# Altium footprint library THU VIEN PCB.PCBLib: 534 footprints (part 23 of 34)
Each footprint in its own frame and in the unit in brackets; x right, y up, seen from the top. Pads: shape width x height; smd on the part's side, far side on the other; paste and mask are expansions set on the pad; w line width, h text height; cw(c..) or ccw(c..) is an arc to the next point about the centre after c.
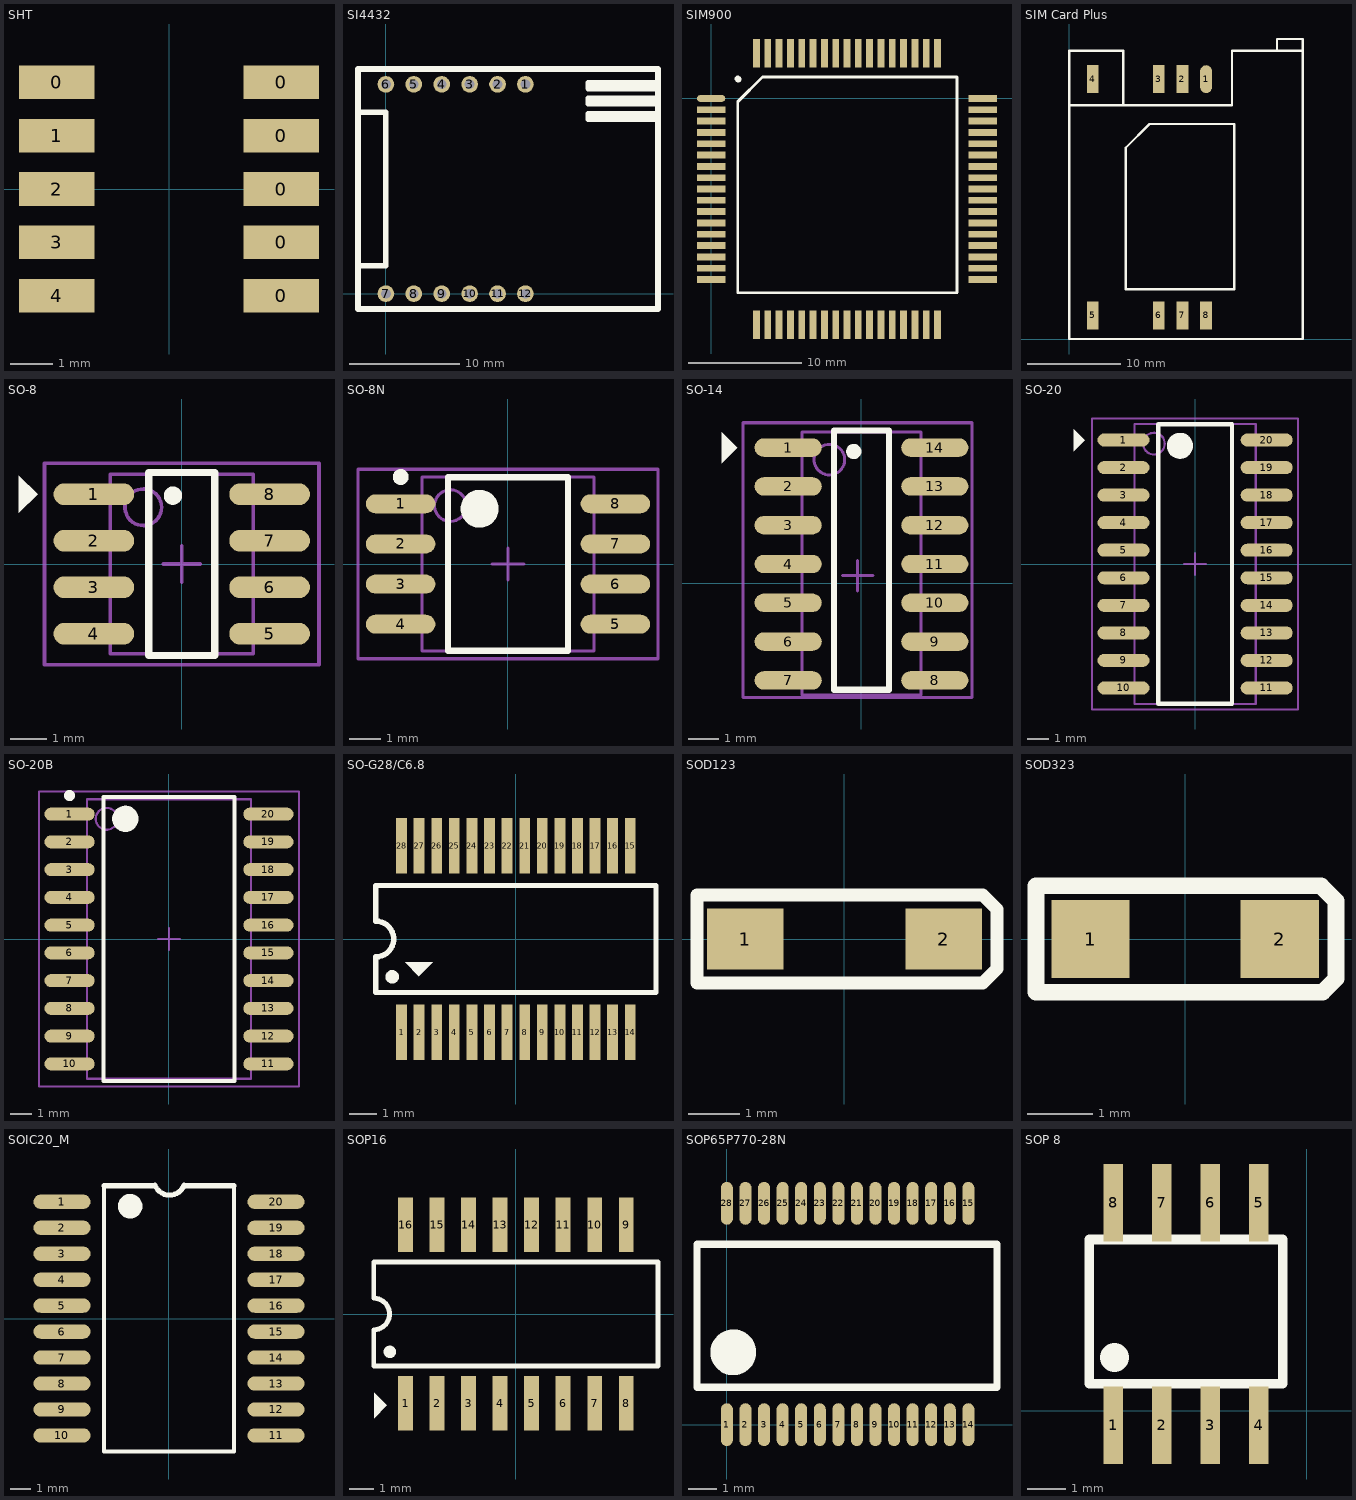
[diagram p22: the footprints below, top view; thin cyan lines are the x and y axes]

## SHT [mm]
pads (10):
  rect 1.8x0.8 smd: 0(-2.667,2.54) 0(2.667,-2.54) 0(2.667,-1.27) 0(2.667,0) 0(2.667,1.27) 0(2.667,2.54) 1(-2.667,1.27) 2(-2.667,0) 3(-2.667,-1.27) 4(-2.667,-2.54)
3D body "User Library-SHT1x.step": height 2.36, standoff 0, extent -2.338,-4.295 2.592,3.175

## SI4432 [mil] "SI4432"
pads (12):
  round 60 hole 35: 1(500,750) 2(400,750) 3(300,750) 4(200,750) 5(100,750) 6(0,750) 7(0,0) 8(100,0) 9(200,0) 10(300,0) 11(400,0) 12(500,0)
Top Overlay:
  lines w20: -100,100 0,100 0,650 -100,650 ; 975,625 725,625 725,645 975,645 ; 975,680 725,680 725,700 975,700 ; 975,735 725,735 725,755 975,755 ; -100,-55 975,-55 975,805 600,805 -100,805 -100,-55

## SIM900 [mm]
pads (68):
  oval 2.5x0.6 smd: 1(0,0)
  rect 2.5x0.6 smd: 2(0,-1) 3(0,-2) 4(0,-3) 5(0,-4) 6(0,-5) 7(0,-6) 8(0,-7) 9(0,-8) 10(0,-9) 11(0,-10) 12(0,-11) 13(0,-12) 14(0,-13) 15(0,-14) 16(0,-15) 17(0,-16) 35(24,-16) 36(24,-15) 37(24,-14) 38(24,-13) 39(24,-12) 40(24,-11) 41(24,-10) 42(24,-9) 43(24,-8) 44(24,-7) 45(24,-6) 46(24,-5) 47(24,-4) 48(24,-3) 49(24,-2) 50(24,-1) 51(24,0)
  rect 0.6x2.5 smd: 18(4,-20) 19(5,-20) 20(6,-20) 21(7,-20) 22(8,-20) 23(9,-20) 24(10,-20) 25(11,-20) 26(12,-20) 27(13,-20) 28(14,-20) 29(15,-20) 30(16,-20) 31(17,-20) 32(18,-20) 33(19,-20) 34(20,-20) 52(20,4) 53(19,4) 54(18,4) 55(17,4) 56(16,4) 57(15,4) 58(14,4) 59(13,4) 60(12,4) 61(11,4) 62(10,4) 63(9,4) 64(8,4) 65(7,4) 66(6,4) 67(5,4) 68(4,4)
Top Overlay:
  lines w0.25: 2.586,-17.16 21.697,-17.16 21.717,-17.14 21.717,1.547 ; 2.675,-17.163 2.357,-17.163 2.347,-17.153 2.347,-0.297 4.526,1.882 21.707,1.882 21.714,1.875 21.714,1.478
  lines w0.55: 2.349,1.73 2.4,1.679 2.413,1.679 2.416,1.679 2.423,1.687
3D body "SIM900.step": height 3.04, standoff 0.02, extent 0,-20 24,4

## SIM Card Plus [mm]
pads (8):
  oval 1.27x3 smd: 1(14.732,27.94)
  rect 1.27x3 smd: 2(12.192,27.94) 3(9.652,27.94) 4(2.54,27.94) 5(2.54,2.54) 6(9.652,2.54) 7(12.192,2.54) 8(14.732,2.54)
Top Overlay:
  lines w0.254: 0,25.146 17.526,25.146 17.526,30.988 22.352,30.988 ; 5.842,25.146 5.842,30.988 0,30.988 0,0 25.146,0 25.146,30.988 ; 22.352,30.988 25.146,30.988 ; 22.352,30.988 22.352,32.258 25.146,32.258 25.146,30.988 ; 6.096,5.334 17.78,5.334 17.78,23.114 8.636,23.114 6.096,20.574 6.096,5.334
3D body "Sim Card Plush.stp": height 3.76, standoff 0.06, extent 0.2,-0.006 25.2,32.194

## SO-8 [mm] "8-Pin Small Outline Integrated Circuit 1.27 mm Pitch, IPC Medium Density"
height 1.75
pads (8):
  oval 2.2x0.6 smd: 1(-2.4,1.905) 2(-2.4,0.635) 3(-2.4,-0.635) 4(-2.4,-1.905) 5(2.4,-1.905) 6(2.4,-0.635) 7(2.4,0.635) 8(2.4,1.905)
Top Overlay:
  circle w0.25: c-0.241,1.866 r0.125
  region: -4.445,1.397 -3.937,1.905 -4.445,2.413
  lines w0.2: -0.9,-2.5 -0.9,2.5 0.9,2.5 0.9,-2.5 -0.9,-2.5
Mechanical 13:
  circle w0.1: c-1.05,1.55 r0.5
  lines w0.1: -1.95,-2.45 -1.95,2.45 1.95,2.45 1.95,-2.45 -1.95,-2.45
Mechanical 15:
  lines w0.1: -0.5,0 0.5,0 ; 0,-0.5 0,0.5 ; -3.75,-2.75 -3.75,2.75 3.75,2.75 3.75,-2.75 -3.75,-2.75
3D body "User Library-sop-8.STEP": height 1.6, standoff 0, extent -2.894,-2.434 3.148,2.586

## SO-8N [mm] "SOP, 8-Leads, Body 5.3x5.3mm, Pitch 1.27mm, IPC Medium Density"
height 2.03
pads (8):
  oval 2.2x0.6 smd: 1(-3.4,1.905) 2(-3.4,0.635) 3(-3.4,-0.635) 4(-3.4,-1.905) 5(3.4,-1.905) 6(3.4,-0.635) 7(3.4,0.635) 8(3.4,1.905)
Top Overlay:
  circle w0.25: c-3.4,2.755 r0.125
  circle w0.6: c-0.9,1.75 r0.3
  lines w0.2: -1.9,-2.75 -1.9,2.75 1.9,2.75 1.9,-2.75 -1.9,-2.75
Mechanical 13:
  circle w0.1: c-1.825,1.85 r0.5
  lines w0.1: -2.725,-2.75 -2.725,2.75 2.725,2.75 2.725,-2.75 -2.725,-2.75
Mechanical 15:
  lines w0.1: -0.5,0 0.5,0 ; 0,-0.5 0,0.5 ; -4.75,-3 -4.75,3 4.75,3 4.75,-3 -4.75,-3
3D body "User Library-sop-8.STEP": height 1.6, standoff 0, extent -3.046,-2.535 2.996,2.485

## SO-14 [mm] "SOIC, 14-Leads, Body 9.9x3.9mm, Pitch 1.27mm, IPC Medium Density"
height 1.75
pads (14):
  oval 2.2x0.6 smd: 1(-2.4,4.445) 2(-2.4,3.175) 3(-2.4,1.905) 4(-2.4,0.635) 5(-2.4,-0.635) 6(-2.4,-1.905) 7(-2.4,-3.175) 8(2.4,-3.175) 9(2.4,-1.905) 10(2.4,-0.635) 11(2.4,0.635) 12(2.4,1.905) 13(2.4,3.175) 14(2.4,4.445)
Top Overlay:
  circle w0.25: c-0.252,4.318 r0.125
  region: -4.572,3.937 -4.064,4.445 -4.572,4.953
  lines w0.2: -0.9,-3.48 0.9,-3.48 0.9,5 -0.9,5 -0.9,-3.48
Mechanical 13:
  circle w0.1: c-1.05,4.05 r0.5
  lines w0.1: -1.95,-3.658 1.95,-3.658 1.95,4.95 -1.95,4.95 -1.95,-3.658
Mechanical 15:
  lines w0.1: -0.627,0.254 0.373,0.254 ; -0.127,-0.246 -0.127,0.754 ; -3.877,-3.734 3.623,-3.734 3.623,5.258 -3.877,5.258 -3.877,-3.734
3D body "User Library-SOP14-p127-780.STEP": height 1.1, standoff 0, extent -3.708,-4.474 3.592,5.726

## SO-20 [mm] "20-Pin Small Outline Package 1.27 mm Pitch"
height 2
pads (20):
  oval 2.4x0.6 smd: 1(-3.3,5.715) 2(-3.3,4.445) 3(-3.3,3.175) 4(-3.3,1.905) 5(-3.3,0.635) 6(-3.3,-0.635) 7(-3.3,-1.905) 8(-3.3,-3.175) 9(-3.3,-4.445) 10(-3.3,-5.715) 11(3.3,-5.715) 12(3.3,-4.445) 13(3.3,-3.175) 14(3.3,-1.905) 15(3.3,-0.635) 16(3.3,0.635) 17(3.3,1.905) 18(3.3,3.175) 19(3.3,4.445) 20(3.3,5.715)
Top Overlay:
  circle w0.6: c-0.7,5.45 r0.3
  region: -5.588,5.207 -5.08,5.715 -5.588,6.223
  lines w0.2: -1.7,-6.45 1.7,-6.45 1.7,6.45 -1.7,6.45 -1.7,-6.45
Mechanical 13:
  circle w0.1: c-1.9,5.55 r0.5
  lines w0.1: -2.8,-6.45 2.8,-6.45 2.8,6.45 -2.8,6.45 -2.8,-6.45
Mechanical 15:
  lines w0.1: -0.5,0 0.5,0 ; 0,-0.5 0,0.5 ; -4.75,-6.7 4.75,-6.7 4.75,6.7 -4.75,6.7 -4.75,-6.7
3D body "User Library-SOP20.STEP": height 1.95, standoff -0.05, extent -4.024,-6.325 4.076,6.375

## SO-20B [mm] "SOIC, 20-Leads, Body 12.8x7.5mm, Pitch 1.27mm, IPC Medium Density"
height 2.6
pads (20):
  oval 2.3x0.6 smd: 1(-4.55,5.715) 2(-4.55,4.445) 3(-4.55,3.175) 4(-4.55,1.905) 5(-4.55,0.635) 6(-4.55,-0.635) 7(-4.55,-1.905) 8(-4.55,-3.175) 9(-4.55,-4.445) 10(-4.55,-5.715) 11(4.55,-5.715) 12(4.55,-4.445) 13(4.55,-3.175) 14(4.55,-1.905) 15(4.55,-0.635) 16(4.55,0.635) 17(4.55,1.905) 18(4.55,3.175) 19(4.55,4.445) 20(4.55,5.715)
Top Overlay:
  circle w0.25: c-4.55,6.565 r0.125
  circle w0.6: c-2,5.5 r0.3
  lines w0.2: -3,-6.5 -3,6.5 3,6.5 3,-6.5 -3,-6.5
Mechanical 13:
  circle w0.1: c-2.85,5.5 r0.5
  lines w0.1: -3.75,-6.4 -3.75,6.4 3.75,6.4 3.75,-6.4 -3.75,-6.4
Mechanical 15:
  lines w0.1: -0.5,0 0.5,0 ; 0,-0.5 0,0.5 ; -5.95,-6.75 -5.95,6.75 5.95,6.75 5.95,-6.75 -5.95,-6.75
3D body "User Library-SOP20.STEP": height 1.95, standoff -0.05, extent -4.101,-6.325 3.999,6.375

## SO-G28/C6.8 [mm] "SSOP, Plastic; 28 Leads; Body Width 5.3 mm; Pitch 0.65 mm"
height 1.99
pads (28):
  rect 0.4x2.05 smd: 1(-4.225,-3.451) 2(-3.575,-3.451) 3(-2.925,-3.451) 4(-2.275,-3.451) 5(-1.625,-3.451) 6(-0.975,-3.451) 7(-0.325,-3.451) 8(0.325,-3.451) 9(0.975,-3.451) 10(1.625,-3.451) 11(2.275,-3.451) 12(2.925,-3.451) 13(3.575,-3.451) 14(4.225,-3.451) 15(4.225,3.451) 16(3.575,3.451) 17(2.925,3.451) 18(2.275,3.451) 19(1.625,3.451) 20(0.975,3.451) 21(0.325,3.451) 22(-0.325,3.451) 23(-0.975,3.451) 24(-1.625,3.451) 25(-2.275,3.451) 26(-2.925,3.451) 27(-3.575,3.451) 28(-4.225,3.451)
Top Overlay:
  circle w0.25: c-4.57,-1.397 r0.125
  region: -4.089,-0.864 -3.581,-1.372 -3.073,-0.864
  lines w0.2: -5.175,-1.975 5.175,-1.975 5.175,1.975 -5.175,1.975 -5.175,0.658 cw(c-5.175,0) -5.175,-0.658 -5.175,-1.975
3D body: height 1.14, standoff 1.02, extent -4.804,-1.748 -4.296,-1.24
3D body: height 1.27, standoff 1.02, extent 2.794,-0.33 3.708,1.067
3D body: height 1.27, standoff 1.02, extent 1.524,-0.305 2.54,1.092
3D body: height 1.27, standoff 1.02, extent 0.254,-0.305 1.168,1.092
3D body: height 1.27, standoff 1.02, extent -0.914,-0.305 -0.102,1.092
3D body: height 1.27, standoff 1.02, extent -3.175,-0.305 -2.362,1.092
3D body: height 1.27, standoff 1.02, extent -2.032,-0.305 -1.245,1.092
3D body: height 0.25, standoff 0, extent -3.759,2.032 -3.378,3.429
3D body: height 0.25, standoff 0, extent -4.42,2.032 -4.039,3.429
3D body: height 0.25, standoff 0, extent -3.124,2.007 -2.743,3.404
3D body: height 0.25, standoff 0, extent -2.464,2.007 -2.083,3.404
3D body: height 0.25, standoff 0, extent -1.829,2.007 -1.448,3.404
3D body: height 0.25, standoff 0, extent -1.168,2.007 -0.787,3.404
3D body: height 0.25, standoff 0, extent -0.508,2.007 -0.127,3.404
3D body: height 0.25, standoff 0, extent 0.152,2.007 0.533,3.404
3D body: height 0.25, standoff 0, extent 0.762,2.007 1.143,3.404
3D body: height 0.25, standoff 0, extent 1.422,2.007 1.803,3.404
3D body: height 0.25, standoff 0, extent 2.083,2.007 2.464,3.404
3D body: height 0.25, standoff 0, extent 2.743,2.007 3.124,3.404
3D body: height 0.25, standoff 0, extent 3.378,2.007 3.759,3.404
3D body: height 0.25, standoff 0, extent 4.039,2.007 4.42,3.404
3D body: height 0.25, standoff 0, extent 4.039,-3.454 4.42,-2.057
3D body: height 0.25, standoff 0, extent 3.378,-3.454 3.759,-2.057
3D body: height 0.25, standoff 0, extent 2.743,-3.454 3.124,-2.057
3D body: height 0.25, standoff 0, extent 2.083,-3.454 2.464,-2.057
3D body: height 0.25, standoff 0, extent 1.422,-3.454 1.803,-2.057
3D body: height 0.25, standoff 0, extent 0.762,-3.454 1.143,-2.057
3D body: height 0.25, standoff 0, extent 0.152,-3.454 0.533,-2.057
3D body: height 0.25, standoff 0, extent -0.508,-3.454 -0.127,-2.057
3D body: height 0.25, standoff 0, extent -1.168,-3.454 -0.787,-2.057
3D body: height 0.25, standoff 0, extent -1.829,-3.454 -1.448,-2.057
3D body: height 0.25, standoff 0, extent -2.464,-3.454 -2.083,-2.057
3D body: height 0.25, standoff 0, extent -3.124,-3.454 -2.743,-2.057
3D body: height 1.02, standoff 0.23, extent -5.156,-1.981 5.258,2.083
3D body: height 0.25, standoff 0, extent -4.42,-3.429 -4.039,-2.032
3D body: height 0.25, standoff 0, extent -3.759,-3.429 -3.378,-2.032

## SOD123 [mm]
pads (2):
  rect 1.5x1.2 smd: 1(-1.95,0) 2(1.95,0)
Top Overlay:
  lines w0.254: -2.896,-0.864 2.718,-0.864 2.997,-0.584 2.997,0.584 2.718,0.864 -2.896,0.864 -2.896,-0.864
3D body "Diode-SOD12.step": height 1.18, standoff 0, extent -1.95,-0.9 1.95,0.9

## SOD323 [mm]
pads (2):
  rect 1.2x1.2 smd: 1(-1.45,0) 2(1.45,0)
Top Overlay:
  lines w0.254: -2.286,-0.813 2.108,-0.813 2.311,-0.61 2.311,0.584 2.083,0.813 -2.286,0.813 -2.286,-0.813
3D body "Diode-SOD323.step": height 1.1, standoff 0, extent -1.3,-0.675 1.3,0.675

## SOIC20_M [mm] "20-Pin Small Outline Integrated Circuit 1.27 mm Pitch, IPC Low Density"
height 2.65
pads (20):
  oval 2.794x0.7 smd: 1(-5.235,5.715) 2(-5.235,4.445) 3(-5.235,3.175) 4(-5.235,1.905) 5(-5.235,0.635) 6(-5.235,-0.635) 7(-5.235,-1.905) 8(-5.235,-3.175) 9(-5.235,-4.445) 10(-5.235,-5.715) 11(5.235,-5.715) 12(5.235,-4.445) 13(5.235,-3.175) 14(5.235,-1.905) 15(5.235,-0.635) 16(5.235,0.635) 17(5.235,1.905) 18(5.235,3.175) 19(5.235,4.445) 20(5.235,5.715)
Top Overlay:
  circle w0.6: c-1.9,5.5 r0.3
  lines w0.2: -3.175,6.5 -3.175,-6.5 3.175,-6.5 3.175,6.5
  lines w0.254: -3.175,6.5 -0.785,6.5 ; -0.692,6.535 ccw(c0.022,6.802) 0.73,6.522 ; 0.785,6.5 3.175,6.5
3D body "SOIC 20.step": height 2.57, standoff -0.08, extent -5.391,-6.477 5.239,6.523

## SOP16 [mm] "Small Outline; 16 Leads; Body Width 5.6 mm; Pitch 1.27 mm"
height 2
pads (16):
  rect 0.6x2.2 smd: 1(-4.445,-3.6) 2(-3.175,-3.6) 3(-1.905,-3.6) 4(-0.635,-3.6) 5(0.635,-3.6) 6(1.905,-3.6) 7(3.175,-3.6) 8(4.445,-3.6) 9(4.445,3.6) 10(3.175,3.6) 11(1.905,3.6) 12(0.635,3.6) 13(-0.635,3.6) 14(-1.905,3.6) 15(-3.175,3.6) 16(-4.445,3.6)
Top Overlay:
  circle w0.25: c-5.078,-1.524 r0.125
  region: -5.715,-4.191 -5.207,-3.683 -5.715,-3.175
  lines w0.2: -5.725,-2.1 5.725,-2.1 5.725,2.1 -5.725,2.1 -5.725,0.635 cw(c-5.725,0) -5.725,-0.635 -5.725,-2.1
3D body "SOP-16.STEP": height 2.1, standoff 0, extent -5.22,-3.627 5.08,3.373

## SOP65P770-28N [mil]
pads (28):
  oval 16.53x59.03 smd mask+7.9: 1(0,0) 2(25.6,0) 3(51.18,0) 4(76.78,0) 5(102.37,0) 6(127.97,0) 7(153.57,0) 8(179.15,0) 9(204.75,0) 10(230.35,0) 11(255.93,0) 12(281.53,0) 13(307.12,0) 14(332.7,0) 15(332.7,305) 16(307.12,305) 17(281.53,305) 18(255.93,305) 19(230.35,305) 20(204.75,305) 21(179.15,305) 22(153.57,305) 23(127.97,305) 24(102.37,305) 25(76.78,305) 26(51.18,305) 27(25.6,305) 28(0,305)
Top Overlay:
  circle w39.37: c8.8,99.7 r11.88
  lines w10: -41.22,51.66 -41.22,248.53 372.21,248.53 372.21,51.66 -41.22,51.66
3D body "SOP65P770x200-28N.step": height 84.65, standoff 0, extent -37.01,0.01 369.69,305.35

## SOP 8 [mil]
pads (8):
  rect 20x80 smd: 1(-200,-15) 2(-150,-15) 3(-100,-15) 4(-50,-15) 5(-50,215) 6(-100,215) 7(-150,215) 8(-200,215)
Top Overlay:
  lines w10: -225,28 -25,28 -25,177 -225,177 -225,28
  lines w30: -199.03,55.09 cw(c-203.05,53.75) -199,55
3D body "sop-8.step": height 62.99, standoff 0, extent -222.81,-17.93 -25.17,219.94